# Altium footprint library VITA_57_FMC.PcbLib: 12 footprints
Each footprint in its own frame and in the unit in brackets; x right, y up, seen from the top. Pads: shape width x height; smd on the part's side, far side on the other; paste and mask are expansions set on the pad; w line width, h text height; cw(c..) or ccw(c..) is an arc to the next point about the centre after c.
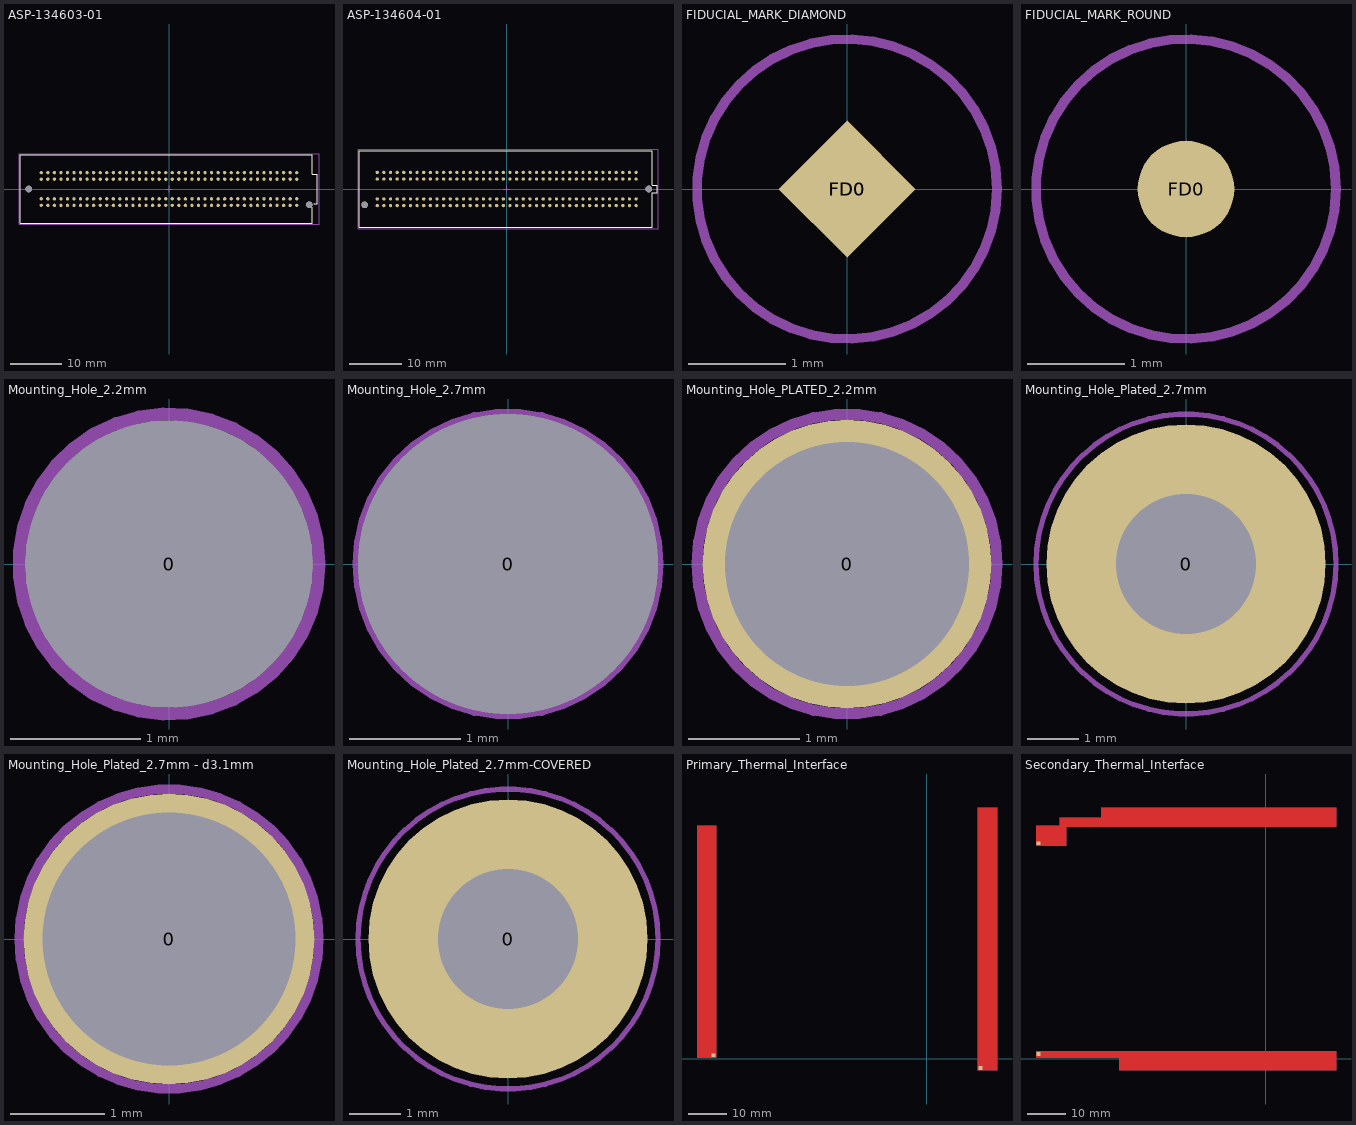
[diagram p0: the footprints below, top view; thin cyan lines are the x and y axes]

## ASP-134603-01 [mil] "1.27mm PITCH SOCKET ARRAY ASSEMBLY, FEMALE, VITA 57 CONNECTOR (LPC)"
height 258
pads (162):
  round 25 smd paste+5 mask+2: C1(975,-125) C2(925,-125) C3(875,-125) C4(825,-125) C5(775,-125) C6(725,-125) C7(675,-125) C8(625,-125) C9(575,-125) C10(525,-125) C11(475,-125) C12(425,-125) C13(375,-125) C14(325,-125) C15(275,-125) C16(225,-125) C17(175,-125) C18(125,-125) C19(75,-125) C20(25,-125) C21(-25,-125) C22(-75,-125) C23(-125,-125) C24(-175,-125) C25(-225,-125) C26(-275,-125) C27(-325,-125) C28(-375,-125) C29(-425,-125) C30(-475,-125) C31(-525,-125) C32(-575,-125) C33(-625,-125) C34(-675,-125) C35(-725,-125) C36(-775,-125) C37(-825,-125) C38(-875,-125) C39(-925,-125) C40(-975,-125) D1(975,-75) D2(925,-75) D3(875,-75) D4(825,-75) D5(775,-75) D6(725,-75) D7(675,-75) D8(625,-75) D9(575,-75) D10(525,-75) D11(475,-75) D12(425,-75) D13(375,-75) D14(325,-75) D15(275,-75) D16(225,-75) D17(175,-75) D18(125,-75) D19(75,-75) D20(25,-75) D21(-25,-75) D22(-75,-75) D23(-125,-75) D24(-175,-75) D25(-225,-75) D26(-275,-75) D27(-325,-75) D28(-375,-75) D29(-425,-75) D30(-475,-75) D31(-525,-75) D32(-575,-75) D33(-625,-75) D34(-675,-75) D35(-725,-75) D36(-775,-75) D37(-825,-75) D38(-875,-75) D39(-925,-75) D40(-975,-75) G1(975,75) G2(925,75) G3(875,75) G4(825,75) G5(775,75) G6(725,75) G7(675,75) G8(625,75) G9(575,75) G10(525,75) G11(475,75) G12(425,75) G13(375,75) G14(325,75) G15(275,75) G16(225,75) G17(175,75) G18(125,75) G19(75,75) G20(25,75) G21(-25,75) G22(-75,75) G23(-125,75) G24(-175,75) G25(-225,75) G26(-275,75) G27(-325,75) G28(-375,75) G29(-425,75) G30(-475,75) G31(-525,75) G32(-575,75) G33(-625,75) G34(-675,75) G35(-725,75) G36(-775,75) G37(-825,75) G38(-875,75) G39(-925,75) G40(-975,75) H1(975,125) H2(925,125) H3(875,125) H4(825,125) H5(775,125) H6(725,125) H7(675,125) H8(625,125) H9(575,125) H10(525,125) H11(475,125) H12(425,125) H13(375,125) H14(325,125) H15(275,125) H16(225,125) H17(175,125) H18(125,125) H19(75,125) H20(25,125) H21(-25,125) H22(-75,125) H23(-125,125) H24(-175,125) H25(-225,125) H26(-275,125) H27(-325,125) H28(-375,125) H29(-425,125) H30(-475,125) H31(-525,125) H32(-575,125) H33(-625,125) H34(-675,125) H35(-725,125) H36(-775,125) H37(-825,125) H38(-875,125) H39(-925,125) H40(-975,125)
  round 50 hole 50 unplated paste+0 mask+0: MH1(-1070.5,0) MH2(1070.5,-120)
Top Overlay:
  lines w7.87: 1095,-140 1095,-260 -1135,-260 -1135,260 1095,260 1095,112.2 1133,112.2 1133,-113.19 1105,-113.19
Mechanical 15:
  lines w3.94: -25,0 25,0 ; 0,-25 0,25 ; -1145,-270 1145,-270 1145,270 -1145,270 -1145,-270
3D body "SEAF-40-06.5-L-10-2-A-K-TR.stp": height 259, standoff -49, extent -1131,-262.5 1131,260.5

## ASP-134604-01 [mil] "1.27mm PITCH TERMINAL ARRAY ASSEMBLY, MALE, VITA 57 CONNECTOR (LPC)"
height 280
pads (162):
  round 25 smd paste+5 mask+2: C1(975,125) C2(925,125) C3(875,125) C4(825,125) C5(775,125) C6(725,125) C7(675,125) C8(625,125) C9(575,125) C10(525,125) C11(475,125) C12(425,125) C13(375,125) C14(325,125) C15(275,125) C16(225,125) C17(175,125) C18(125,125) C19(75,125) C20(25,125) C21(-25,125) C22(-75,125) C23(-125,125) C24(-175,125) C25(-225,125) C26(-275,125) C27(-325,125) C28(-375,125) C29(-425,125) C30(-475,125) C31(-525,125) C32(-575,125) C33(-625,125) C34(-675,125) C35(-725,125) C36(-775,125) C37(-825,125) C38(-875,125) C39(-925,125) C40(-975,125) D1(975,75) D2(925,75) D3(875,75) D4(825,75) D5(775,75) D6(725,75) D7(675,75) D8(625,75) D9(575,75) D10(525,75) D11(475,75) D12(425,75) D13(375,75) D14(325,75) D15(275,75) D16(225,75) D17(175,75) D18(125,75) D19(75,75) D20(25,75) D21(-25,75) D22(-75,75) D23(-125,75) D24(-175,75) D25(-225,75) D26(-275,75) D27(-325,75) D28(-375,75) D29(-425,75) D30(-475,75) D31(-525,75) D32(-575,75) D33(-625,75) D34(-675,75) D35(-725,75) D36(-775,75) D37(-825,75) D38(-875,75) D39(-925,75) D40(-975,75) G1(975,-75) G2(925,-75) G3(875,-75) G4(825,-75) G5(775,-75) G6(725,-75) G7(675,-75) G8(625,-75) G9(575,-75) G10(525,-75) G11(475,-75) G12(425,-75) G13(375,-75) G14(325,-75) G15(275,-75) G16(225,-75) G17(175,-75) G18(125,-75) G19(75,-75) G20(25,-75) G21(-25,-75) G22(-75,-75) G23(-125,-75) G24(-175,-75) G25(-225,-75) G26(-275,-75) G27(-325,-75) G28(-375,-75) G29(-425,-75) G30(-475,-75) G31(-525,-75) G32(-575,-75) G33(-625,-75) G34(-675,-75) G35(-725,-75) G36(-775,-75) G37(-825,-75) G38(-875,-75) G39(-925,-75) G40(-975,-75) H1(975,-125) H2(925,-125) H3(875,-125) H4(825,-125) H5(775,-125) H6(725,-125) H7(675,-125) H8(625,-125) H9(575,-125) H10(525,-125) H11(475,-125) H12(425,-125) H13(375,-125) H14(325,-125) H15(275,-125) H16(225,-125) H17(175,-125) H18(125,-125) H19(75,-125) H20(25,-125) H21(-25,-125) H22(-75,-125) H23(-125,-125) H24(-175,-125) H25(-225,-125) H26(-275,-125) H27(-325,-125) H28(-375,-125) H29(-425,-125) H30(-475,-125) H31(-525,-125) H32(-575,-125) H33(-625,-125) H34(-675,-125) H35(-725,-125) H36(-775,-125) H37(-825,-125) H38(-875,-125) H39(-925,-125) H40(-975,-125)
  round 50 hole 50 unplated paste+0 mask+0: MH1(1070.5,0) MH2(-1070.5,-120)
Top Overlay:
  lines w7.87: -1110,-289 -1110,289 1098,289 1098,30 1133,30 1133,-30 1098,-30 1098,-289 -1110,-289
Mechanical 15:
  lines w3.94: -25,0 25,0 ; 0,-25 0,25 ; 1140,-35 1140,300 -1120,300 -1120,-300 1120,-300 1140,-300 1140,-20
3D body "SEAM-40-03.5-S-10-2-A-K-TR.stp": height 281.07, standoff -48.93, extent -1098,-289 1133,289

## FIDUCIAL_MARK_DIAMOND [mm] "fiducial mark, diamond, 1 mm squared, 3 mm keep-out"
pads (2):
  rect 1x1 smd rot 45 paste+0 mask+0: FD0(0,0)
  round 3 on Top Solder paste+0 mask+0: FD0(0,0)
Mechanical 1:
  circle w0.1: c0,0 r1.55

## FIDUCIAL_MARK_ROUND [mm] "fiducial mark, round, 1 mm diameter, 3 mm keep-out"
pads (1):
  round 1 smd paste+0 mask+1: FD0(0,0)
Mechanical 1:
  circle w0.1: c0,0 r1.55

## Mounting_Hole_2.2mm [mm] "Mounting Hole, hole 2.2mm"
pads (1):
  round 2.2 hole 2.2 unplated mask+0: 0(0,0)
Mechanical 1:
  circle w0.1: c0,0 r1.15

## Mounting_Hole_2.7mm [mm] "Mounting Hole, hole 2.7mm"
pads (1):
  round 2.7 hole 2.7 unplated mask+0: 0(0,0)
Mechanical 1:
  circle w0.1: c0,0 r1.35

## Mounting_Hole_PLATED_2.2mm [mm] "Mounting Hole, hole 2.2mm"
pads (1):
  round 2.6 hole 2.2 mask+0: 0(0,0)
Mechanical 1:
  circle w0.1: c0,0 r1.35

## Mounting_Hole_Plated_2.7mm [mm] "Mounting Hole, hole 2.7mm, diameter 5.4mm, Keepout R 2.9mm, plated"
pads (1):
  round 5.4 hole 2.7 mask+0: 0(0,0)
Mechanical 1:
  circle w0.1: c0,0 r2.9

## Mounting_Hole_Plated_2.7mm - d3.1mm [mm] "Mounting Hole, hole 2.7mm, diameter 3.1mm, Keepout R 3.2mm, plated"
pads (1):
  round 3.1 hole 2.7 mask+0: 0(0,0)
Mechanical 1:
  circle w0.1: c0,0 r1.6

## Mounting_Hole_Plated_2.7mm-COVERED [mm] "Mounting Hole, hole 2.7mm, diameter 5.4mm, Keepout R 2.9mm, plated, covered with solder mask"
pads (1):
  round 5.4 hole 2.7 mask+0.2: 0(0,0)
Mechanical 1:
  circle w0.1: c0,0 r2.9

## Primary_Thermal_Interface [mm] "Primary thermal interfaces for FMC module"
pads (2):
  rect 1x1 smd: 0(-56.075,0.975) 1(14.05,-2.35)
Top Layer:
  region: 18.4,66 13.4,66 13.4,-3 18.4,-3
  region: -60.4,0.3 -60.4,61.3 -55.4,61.3 -55.4,0.3
Bottom Layer:
  region: -60.4,61.3 -55.4,61.3 -55.4,0.3 -60.4,0.3
  region: 13.4,66 18.4,66 18.4,-3 13.4,-3

## Secondary_Thermal_Interface [mm] "Secondary thermal interfaces for FMC module"
pads (2):
  rect 1x1 smd: 0(-59.725,56.675) 1(-59.725,1.325)
Top Layer:
  region: 18.4,-3 18.4,2 -60.4,2 -60.4,0.3 -38.5,0.3 -38.5,-3
  region: 18.4,66 18.4,61 -52.4,61 -52.4,56 -60.4,56 -60.4,61.3 -54.1,61.3 -54.1,63.4 -43.3,63.4 -43.3,66
Bottom Layer:
  region: 18.4,-3 18.4,2 -60.4,2 -60.4,0.3 -38.5,0.3 -38.5,-3
  region: 18.4,66 18.4,61 -52.4,61 -52.4,56 -60.4,56 -60.4,61.3 -54.1,61.3 -54.1,63.4 -43.3,63.4 -43.3,66